# Altium footprint library generated_footprints.PcbLib: 38 footprints (part 3 of 3)
Each footprint in its own frame and in the unit in brackets; x right, y up, seen from the top. Pads: shape width x height; smd on the part's side, far side on the other; paste and mask are expansions set on the pad; w line width, h text height; cw(c..) or ccw(c..) is an arc to the next point about the centre after c.
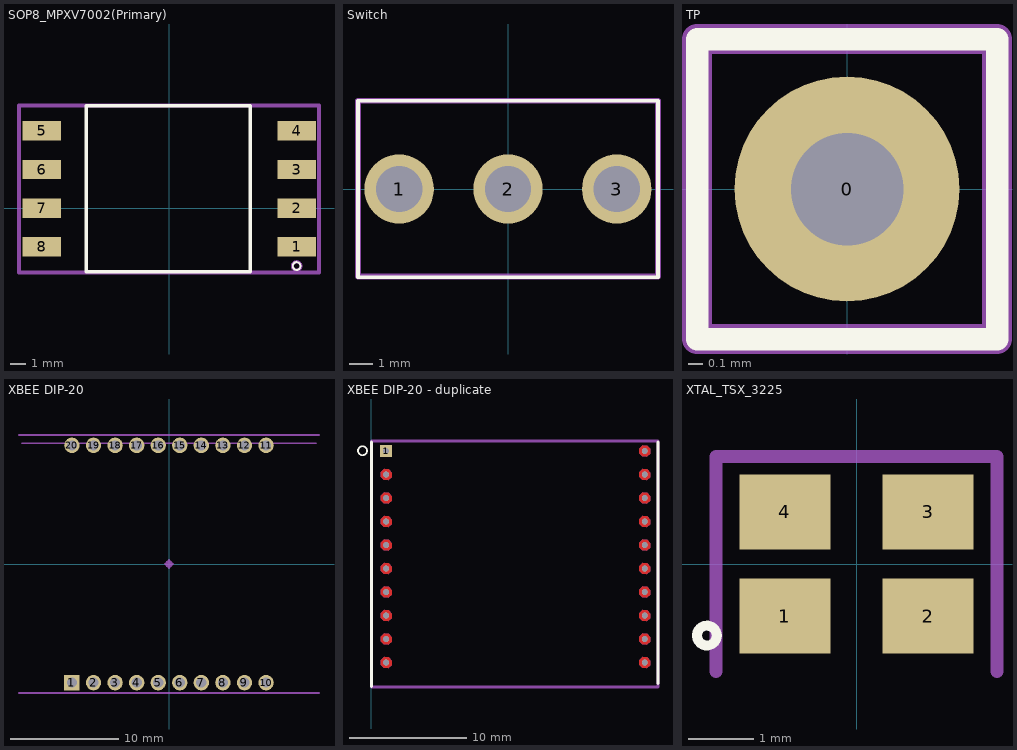
[diagram p2: the footprints below, top view; thin cyan lines are the x and y axes]

## SOP8_MPXV7002(Primary) [mil]
pads (8):
  rect 100x50 smd paste-1000 mask-1000: 1(330,-100) 2(330,0) 3(330,100) 4(330,200) 5(-330,200) 6(-330,100) 7(-330,0) 8(-330,-100)
Top Overlay:
  circle w5: c330,-150 r10
  lines w10: -215,-165 210,-165 210,265 -215,265 -215,-165
Top Paste:
  region: 280,175 380,175 380,225 280,225
  region: 280,75 380,75 380,125 280,125
  region: -380,175 -280,175 -280,225 -380,225
  region: -380,75 -280,75 -280,125 -380,125
  region: 280,-125 380,-125 380,-75 280,-75
  region: -380,-125 -280,-125 -280,-75 -380,-75
  region: 280,-25 380,-25 380,25 280,25
  region: -380,-25 -280,-25 -280,25 -380,25
Top Solder:
  region: 276.06,171.06 383.94,171.06 383.94,228.94 276.06,228.94
  region: 276.06,71.06 383.94,71.06 383.94,128.94 276.06,128.94
  region: -383.94,171.06 -276.06,171.06 -276.06,228.94 -383.94,228.94
  region: -383.94,71.06 -276.06,71.06 -276.06,128.94 -383.94,128.94
  region: 276.06,-128.94 383.94,-128.94 383.94,-71.06 276.06,-71.06
  region: -383.94,-128.94 -276.06,-128.94 -276.06,-71.06 -383.94,-71.06
  region: 276.06,-28.94 383.94,-28.94 383.94,28.94 276.06,28.94
  region: -383.94,-28.94 -276.06,-28.94 -276.06,28.94 -383.94,28.94
Mechanical 15:
  circle w8: c330,-150 r11.05
  lines w10: -389,-167 388,-167 388,266 -389,266 -389,-167
  text ".Designator" at -127,5 h200

## Switch [mm]
pads (3):
  round 3 hole 2: 1(-4.7,0) 2(0,0) 3(4.698,0)
Top Overlay:
  lines w0.152: -6.477,-3.81 -6.477,3.81 6.477,3.81 6.477,-3.81 -6.477,-3.81
Mechanical 15:
  lines w0.254: -6.477,-3.785 -6.477,3.81 6.477,3.81 6.477,-3.785 -6.477,-3.785
  text ".Designator" at -2.667,-0.762 h2.54
3D body "M2012LL1W01.stp": height 34.71, standoff -4.17, extent -6.528,-6.12 6.477,5.866

## TP [mil]
pads (1):
  round 60 hole 30: 0(0,0)
Top Overlay:
  lines w6: -40,-40 40,-40 40,40 -40,40 -40,-40
Mechanical 15:
  lines w8: -40,-40 40,-40 40,40 -40,40 -40,-40
  text ".Designator" at -34,-7 h40
3D body "User Library-Single Pin Header.step": height 318.31, standoff -106.69, extent -50,-50 50,50

## XBEE DIP-20 [mm] "DIPS, 22.00 mm lead span, 2.00 mm pitch; 20 pin, 27.31 mm L X 22.38 mm W X 7.00 mm H body"
height 7
pads (20):
  rect 1.43x1.43 hole 0.95 paste-1.43: 1(-9,-11)
  round 1.43 hole 0.95 paste-1.43: 2(-7,-11) 3(-5,-11) 4(-3,-11) 5(-1,-11) 6(1,-11) 7(3,-11) 8(5,-11) 9(7,-11) 10(9,-11) 11(9,11) 12(7,11) 13(5,11) 14(3,11) 15(1,11) 16(-1,11) 17(-3,11) 18(-5,11) 19(-7,11) 20(-9,11)
Mechanical 11:
  lines w0.152: -13.66,11.19 13.66,11.19
Mechanical 15:
  circle w0.203: c0,0 r0.25
  lines w0.203: -13.91,-11.97 13.91,-11.97 ; -13.91,11.97 13.91,11.97 ; -0.35,0 0.35,0 ; 0,-0.35 0,0.35
  text ".Designator" at -9.195,0.991 h5.08

## XBEE DIP-20 - duplicate [mm]
pads (20):
  rect 1.008x1.008 hole 0.5 mask-25.4: 1(1.254,26.009)
  round 0.5 hole 0.5 mask-25.4: 2(1.254,24.009) 3(1.254,22.009) 4(1.254,20.009) 5(1.254,18.009) 6(1.254,16.009) 7(1.254,14.009) 8(1.254,12.009) 9(1.254,10.009) 10(1.254,8.009) 11(23.254,8.009) 12(23.254,10.009) 13(23.254,12.009) 14(23.254,14.009) 15(23.254,16.009) 16(23.254,18.009) 17(23.254,20.009) 18(23.254,22.009) 19(23.254,24.009) 20(23.254,26.009)
Top Layer:
  region: 1.728,24.181 1.467,24.466 1.082,24.483 0.797,24.222 0.78,23.837 1.041,23.552 1.426,23.535 1.711,23.796
  region: 1.728,22.181 1.467,22.466 1.082,22.483 0.797,22.222 0.78,21.837 1.041,21.552 1.426,21.535 1.711,21.796
  region: 1.728,20.181 1.467,20.466 1.082,20.483 0.797,20.222 0.78,19.837 1.041,19.552 1.426,19.535 1.711,19.796
  region: 1.728,18.181 1.467,18.466 1.082,18.483 0.797,18.222 0.78,17.837 1.041,17.552 1.426,17.535 1.711,17.796
  region: 1.728,16.181 1.467,16.466 1.082,16.483 0.797,16.222 0.78,15.837 1.041,15.552 1.426,15.535 1.711,15.796
  region: 1.728,14.181 1.467,14.466 1.082,14.483 0.797,14.222 0.78,13.837 1.041,13.552 1.426,13.535 1.711,13.796
  region: 1.728,12.181 1.467,12.466 1.082,12.483 0.797,12.222 0.78,11.837 1.041,11.552 1.426,11.535 1.711,11.796
  region: 1.728,10.181 1.467,10.466 1.082,10.483 0.797,10.222 0.78,9.837 1.041,9.552 1.426,9.535 1.711,9.796
  region: 1.728,8.181 1.467,8.466 1.082,8.483 0.797,8.222 0.78,7.837 1.041,7.552 1.426,7.535 1.711,7.796
  region: 23.728,26.181 23.467,26.466 23.082,26.483 22.797,26.222 22.78,25.837 23.041,25.552 23.426,25.535 23.711,25.796
  region: 23.728,24.181 23.467,24.466 23.082,24.483 22.797,24.222 22.78,23.837 23.041,23.552 23.426,23.535 23.711,23.796
  region: 23.728,22.181 23.467,22.466 23.082,22.483 22.797,22.222 22.78,21.837 23.041,21.552 23.426,21.535 23.711,21.796
  region: 23.728,20.181 23.467,20.466 23.082,20.483 22.797,20.222 22.78,19.837 23.041,19.552 23.426,19.535 23.711,19.796
  region: 23.728,18.181 23.467,18.466 23.082,18.483 22.797,18.222 22.78,17.837 23.041,17.552 23.426,17.535 23.711,17.796
  region: 23.728,16.181 23.467,16.466 23.082,16.483 22.797,16.222 22.78,15.837 23.041,15.552 23.426,15.535 23.711,15.796
  region: 23.728,14.181 23.467,14.466 23.082,14.483 22.797,14.222 22.78,13.837 23.041,13.552 23.426,13.535 23.711,13.796
  region: 23.728,12.181 23.467,12.466 23.082,12.483 22.797,12.222 22.78,11.837 23.041,11.552 23.426,11.535 23.711,11.796
  region: 23.728,10.181 23.467,10.466 23.082,10.483 22.797,10.222 22.78,9.837 23.041,9.552 23.426,9.535 23.711,9.796
  region: 23.728,8.181 23.467,8.466 23.082,8.483 22.797,8.222 22.78,7.837 23.041,7.552 23.426,7.535 23.711,7.796
Bottom Layer:
  region: 1.728,24.181 1.467,24.466 1.082,24.483 0.797,24.222 0.78,23.837 1.041,23.552 1.426,23.535 1.711,23.796
  region: 1.728,22.181 1.467,22.466 1.082,22.483 0.797,22.222 0.78,21.837 1.041,21.552 1.426,21.535 1.711,21.796
  region: 1.728,20.181 1.467,20.466 1.082,20.483 0.797,20.222 0.78,19.837 1.041,19.552 1.426,19.535 1.711,19.796
  region: 1.728,18.181 1.467,18.466 1.082,18.483 0.797,18.222 0.78,17.837 1.041,17.552 1.426,17.535 1.711,17.796
  region: 1.728,16.181 1.467,16.466 1.082,16.483 0.797,16.222 0.78,15.837 1.041,15.552 1.426,15.535 1.711,15.796
  region: 1.728,14.181 1.467,14.466 1.082,14.483 0.797,14.222 0.78,13.837 1.041,13.552 1.426,13.535 1.711,13.796
  region: 1.728,12.181 1.467,12.466 1.082,12.483 0.797,12.222 0.78,11.837 1.041,11.552 1.426,11.535 1.711,11.796
  region: 1.728,10.181 1.467,10.466 1.082,10.483 0.797,10.222 0.78,9.837 1.041,9.552 1.426,9.535 1.711,9.796
  region: 1.728,8.181 1.467,8.466 1.082,8.483 0.797,8.222 0.78,7.837 1.041,7.552 1.426,7.535 1.711,7.796
  region: 23.728,26.181 23.467,26.466 23.082,26.483 22.797,26.222 22.78,25.837 23.041,25.552 23.426,25.535 23.711,25.796
  region: 23.728,24.181 23.467,24.466 23.082,24.483 22.797,24.222 22.78,23.837 23.041,23.552 23.426,23.535 23.711,23.796
  region: 23.728,22.181 23.467,22.466 23.082,22.483 22.797,22.222 22.78,21.837 23.041,21.552 23.426,21.535 23.711,21.796
  region: 23.728,20.181 23.467,20.466 23.082,20.483 22.797,20.222 22.78,19.837 23.041,19.552 23.426,19.535 23.711,19.796
  region: 23.728,18.181 23.467,18.466 23.082,18.483 22.797,18.222 22.78,17.837 23.041,17.552 23.426,17.535 23.711,17.796
  region: 23.728,16.181 23.467,16.466 23.082,16.483 22.797,16.222 22.78,15.837 23.041,15.552 23.426,15.535 23.711,15.796
  region: 23.728,14.181 23.467,14.466 23.082,14.483 22.797,14.222 22.78,13.837 23.041,13.552 23.426,13.535 23.711,13.796
  region: 23.728,12.181 23.467,12.466 23.082,12.483 22.797,12.222 22.78,11.837 23.041,11.552 23.426,11.535 23.711,11.796
  region: 23.728,10.181 23.467,10.466 23.082,10.483 22.797,10.222 22.78,9.837 23.041,9.552 23.426,9.535 23.711,9.796
  region: 23.728,8.181 23.467,8.466 23.082,8.483 22.797,8.222 22.78,7.837 23.041,7.552 23.426,7.535 23.711,7.796
Top Overlay:
  circle w0.152: c-0.762,26.035 r0.381
  lines w0.254: 0,5.969 0,26.797 ; 24.384,6.223 24.384,26.797
Top Solder:
  drawing of 20 lines, arcs and shapes, not listed
Bottom Solder:
  drawing of 20 lines, arcs and shapes, not listed
Mechanical 15:
  lines w0.254: 0,5.918 0,26.873 24.384,26.873 24.384,5.918 0,5.918
  text ".Designator" at 7.315,16.637 h5.08
Multi-Layer:
  drawing of 19 lines, arcs and shapes, not listed
3D body "SW3dPS-XBEE Pro.STEP": height 12.2, standoff -1.39, extent 0.256,0.635 24.636,33.575

## XTAL_TSX_3225 [mm] "Crystal, Dual Flat No-Lead (DFN 4 Pins), 2.00 mm pitch; 4 pin, 3.20 mm L X 2.50 mm W X 0.60 mm H body"
height 0.6
pads (4):
  rect 1.4x1.15 smd: 1(-1.1,-0.8) 2(1.1,-0.8) 3(1.1,0.8) 4(-1.1,0.8)
Top Overlay:
  circle w0.152: c-2.3,-1.1 r0.152
Mechanical 15:
  lines w0.203: -2.159,-1.651 -2.159,1.651 2.159,1.651 2.159,-1.651
  text ".Designator" at -1.397,-0.711 h1.52